# Altium footprint library Standard.PcbLib: 148 footprints (part 9 of 10)
Each footprint in its own frame and in the unit in brackets; x right, y up, seen from the top. Pads: shape width x height; smd on the part's side, far side on the other; paste and mask are expansions set on the pad; w line width, h text height; cw(c..) or ccw(c..) is an arc to the next point about the centre after c.
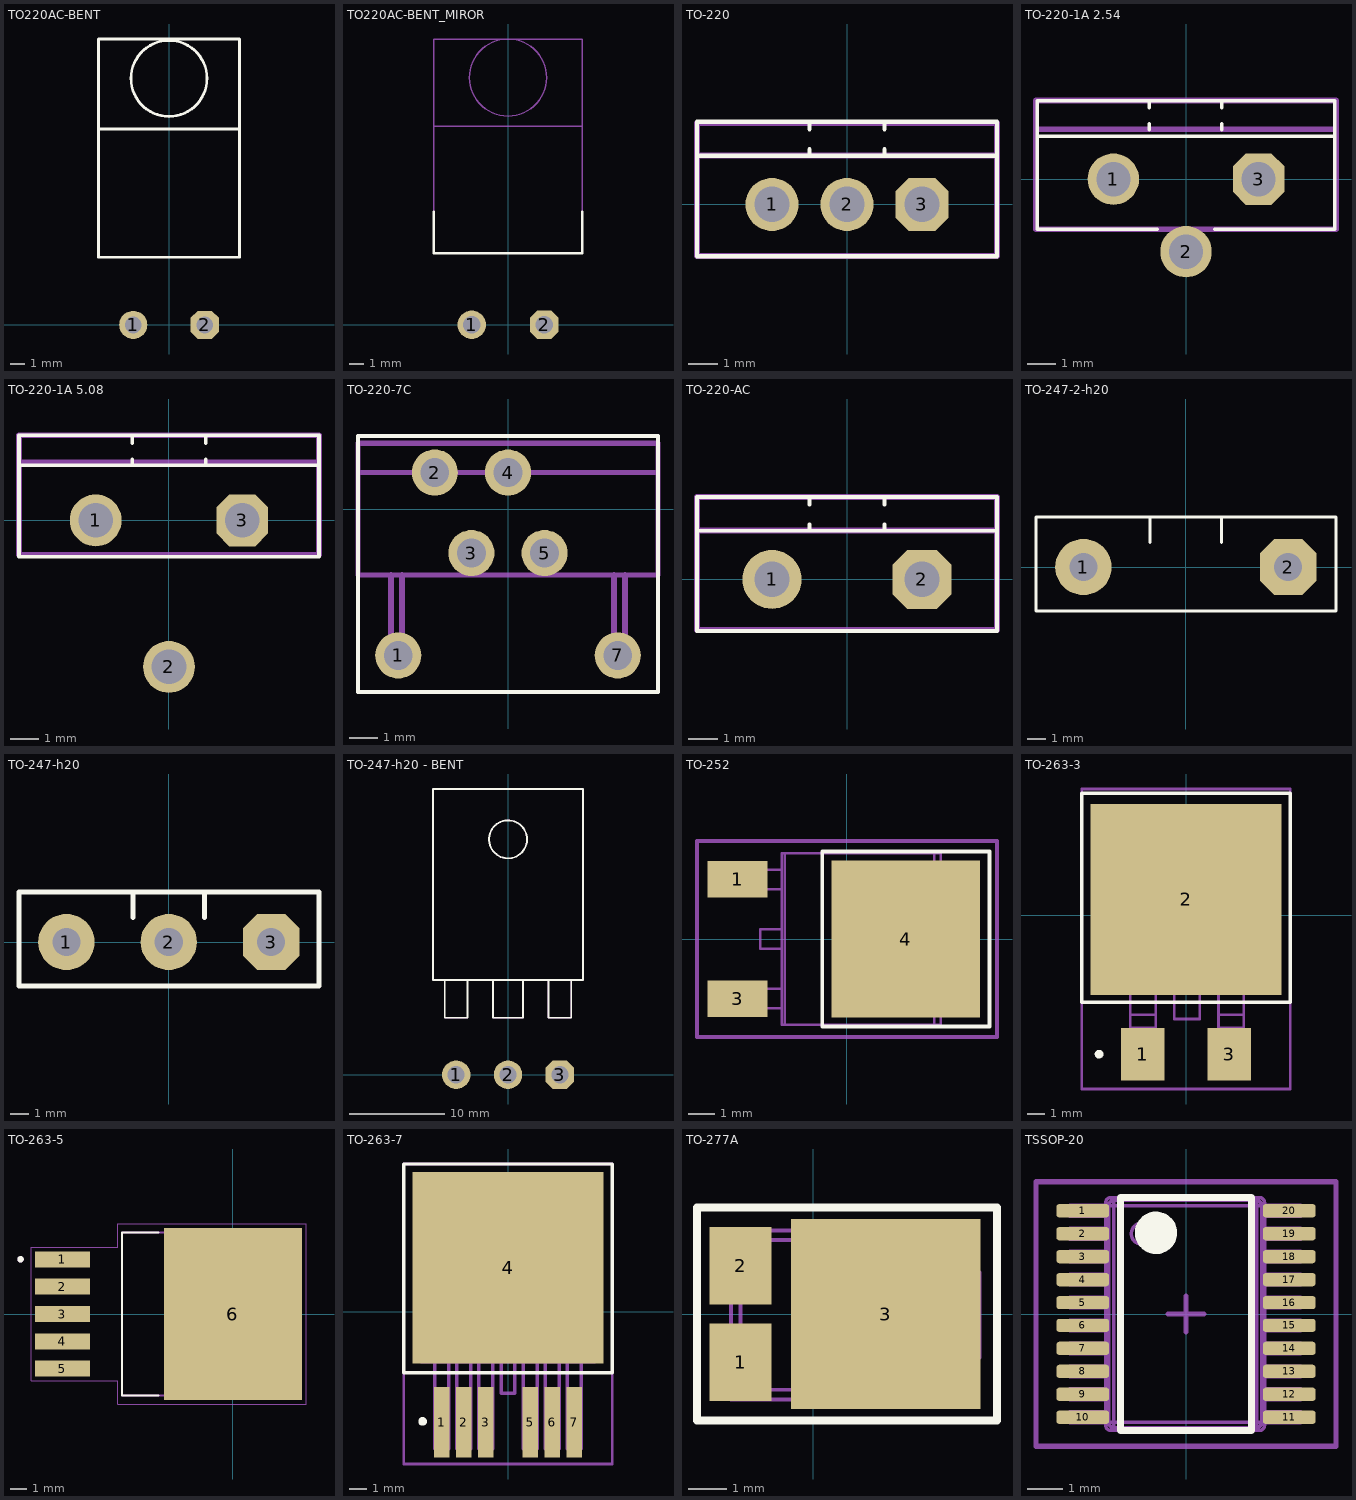
[diagram p8: the footprints below, top view; thin cyan lines are the x and y axes]

## TO220AC-BENT [mm]
pads (2):
  round 2 hole 1.2: 1(-2.54,0)
  oct 2x2 hole 1.2: 2(2.54,0)
Top Overlay:
  circle w0.2: c0,17.5 r2.7
  lines w0.2: -5,13.9 5,13.9 ; -5,20.25 -5,4.8 5,4.8 5,20.25 ; -5,20.3 5,20.3
Top Assembly:
  circle w0.1: c0,17.5 r2.7
  lines w0.1: -5,13.899 5,13.9 ; -5,4.8 5,4.8 5,20.3 -5,20.3 -5,4.8
3D body "User Library-TO220-2pin bent.STEP": height 4.6, standoff -2.47, extent -5,-0.3 5,20.3

## TO220AC-BENT_MIROR [mm]
pads (2):
  round 2 hole 1.2: 1(-2.54,0)
  oct 2x2 hole 1.2: 2(2.54,0)
Top Overlay:
  lines w0.2: -5.2,7.9 -5.2,5 5.2,5 5.2,7.9
Top Assembly:
  circle w0.1: c0,17.3 r2.7
  lines w0.1: -5.2,13.899 5.2,13.9 ; -5.2,5.009 5.2,5.009 5.2,20 -5.2,20 -5.2,5.009
3D body "User Library-TO220-2_OR-INV.STEP": height 2.02, standoff -6.2, extent -5,-0.3 5,20.3

## TO-220 [mm]
pads (3):
  round 1.8 hole 1.2: 1(-2.54,0) 2(0,0)
  oct 1.8x1.8 hole 1.2: 3(2.54,0)
Top Overlay:
  lines w0.15: -5.08,1.651 5.08,1.651 ; -1.27,1.651 -1.27,1.863 ; -1.27,2.54 -1.27,2.794 ; 1.27,1.651 1.27,1.863 ; 1.27,2.54 1.27,2.794 ; -5.08,-1.749 5.08,-1.749 5.08,2.794 -5.08,2.794 -5.08,-1.749
Top Assembly:
  lines w0.2: -5.08,1.651 5.08,1.651 ; -5.08,-1.742 5.08,-1.742 5.08,2.758 -5.08,2.758 -5.08,-1.742
3D body "User Library-TO-220-4.STEP": height 25.06, standoff -3.74, extent -5.12,-1.742 5.08,2.758

## TO-220-1A 2.54 [mm]
pads (3):
  round 1.8 hole 1.2: 1(-2.54,0) 2(0,-2.54)
  oct 1.8x1.8 hole 1.2: 3(2.54,0)
Top Overlay:
  lines w0.125: -5.2,1.5 5.2,1.5 ; -1.29,1.734 -1.29,1.946 ; -1.29,2.496 -1.29,2.75 ; -1,-1.75 -2.525,-1.75 -5.2,-1.75 -5.2,2.75 5.2,2.75 5.2,-1.75 1,-1.75 ; 1.25,1.734 1.25,1.946 ; 1.25,2.496 1.25,2.75
Top Assembly:
  lines w0.2: -0.35,-1.75 -0.35,-2.259 ; 0.45,-1.75 0.45,-2.259 ; -5.25,1.75 -5.25,2.75 5.25,2.75 5.25,1.75 ; -5.25,1.75 5.25,1.75 ; -5.25,1.75 -5.25,1.1 -5.25,-1.75 5.25,-1.75 5.25,1.75 ; -0.35,-2.259 -0.35,-2.495 0.45,-2.495 0.45,-2.259 ; -0.35,-2.259 0.45,-2.259
3D body "TO220-1A 2.54.STEP": height 23.29, standoff -3.87, extent -5.2,-2.991 5.2,2.75

## TO-220-1A 5.08 [mm]
pads (3):
  round 1.8 hole 1.2: 1(-2.54,0) 2(0,-5.08)
  oct 1.8x1.8 hole 1.2: 3(2.54,0)
Top Overlay:
  lines w0.125: -5.2,1.905 5.2,1.905 ; -1.27,1.905 -1.27,2.117 ; -1.27,2.667 -1.27,2.921 ; 1.27,1.905 1.27,2.117 ; 1.27,2.667 1.27,2.921 ; -5.2,-1.27 5.2,-1.27 5.2,2.95 -5.2,2.95 -5.2,-1.27
Top Assembly:
  lines w0.2: -5.2,2 5.2,2 ; -5.2,-1.191 5.2,-1.191 5.2,2.95 -5.2,2.95 -5.2,-1.191
3D body "TO220-1A 5.08.STEP": height 23.29, standoff -2.41, extent -5.2,-5.331 5.2,2.95

## TO-220-7C [mm]
pads (6):
  round 1.6 hole 1: 1(-3.81,-5.08) 2(-2.54,1.27) 3(-1.27,-1.524) 4(0,1.27) 5(1.27,-1.524) 7(3.81,-5.08)
Top Overlay:
  lines w0.15: -5.207,-6.35 5.207,-6.35 5.207,2.54 -5.207,2.54 -5.207,-6.35
Top Assembly:
  lines w0.178: -5.207,1.27 5.207,1.27 ; -5.207,-2.286 5.207,-2.286 5.207,2.286 -5.207,2.286 -5.207,-2.286
  lines w0.2: -4.064,-2.286 -4.064,-5.461 -3.683,-5.461 -3.683,-5.08 -3.683,-2.286 ; 3.683,-2.286 3.683,-5.461 4.064,-5.461 4.064,-5.08 4.064,-2.286
3D body "User Library-TO-220-7C.step": height 19.26, standoff -2.18, extent -5.193,-5.463 5.207,2.667

## TO-220-AC [mm]
pads (2):
  round 2 hole 1.2: 1(-2.54,0)
  oct 2x2 hole 1.2: 2(2.54,0)
Top Overlay:
  lines w0.125: -5.08,1.651 5.08,1.651 ; -1.27,1.651 -1.27,1.863 ; -1.27,2.54 -1.27,2.794 ; 1.27,1.651 1.27,1.863 ; 1.27,2.54 1.27,2.794 ; -5.08,-1.749 5.08,-1.749 5.08,2.794 -5.08,2.794 -5.08,-1.749
Top Assembly:
  lines w0.2: -5,1.651 5,1.651 ; -5.08,-1.706 5.08,-1.706 5.08,2.794 -5.08,2.794 -5.08,-1.706
3D body "User Library-TO220-2_V-L.STEP": height 25.04, standoff -4.46, extent -5,-1.706 5,2.794

## TO-247-2-h20 [mm]
pads (2):
  round 3 hole 1.5: 1(-5.45,0)
  oct 3x3 hole 1.5: 2(5.45,0)
Top Overlay:
  lines w0.15: -1.905,1.3 -1.905,2.66 ; 1.905,1.3 1.905,2.66 ; -7.975,-2.34 -7.975,2.66 8,2.66 8,-2.34 -7.975,-2.34
3D body "User Library-TO247-2.step": height 26, standoff -15.07, extent -7.962,-2.37 7.988,2.66

## TO-247-h20 [mm]
pads (3):
  round 3 hole 1.5: 1(-5.45,0) 2(0,0)
  oct 3x3 hole 1.5: 3(5.45,0)
Top Overlay:
  lines w0.254: -1.905,1.3 -1.905,2.66 ; 1.905,1.3 1.905,2.66 ; -7.975,-2.34 -7.975,2.66 8,2.66 8,-2.34 -7.975,-2.34
Top Assembly:
  lines w0.15: 8,-2.34 8,2.66
  lines w0.2: -1.905,1.3 -1.905,2.66 ; 1.905,1.3 1.905,2.66 ; 8,-2.34 -7.975,-2.34 -7.975,2.66 8,2.66
3D body "TO247-10.STEP": height 26.2, standoff -4.38, extent -8,-2.34 8,2.66

## TO-247-h20 - BENT [mm]
pads (3):
  round 3 hole 1.8: 1(-5.46,0) 2(0,0)
  oct 3x3 hole 1.8: 3(5.46,0)
Top Overlay:
  circle w0.2: c0,24.8 r2
  lines w0.2: -6.66,10 -6.66,6 -4.26,6 -4.26,10 ; -1.6,10 -1.6,6 1.6,6 1.6,10 ; 3.02,10 3.22,10 ; 4.26,10 4.26,6 6.66,6 6.66,10 ; -7.9,10 7.9,10 7.9,30.1 -7.9,30.1 -7.9,10
Top Assembly:
  circle w0.1: c0,24.8 r2
  lines w0.1: -6.66,10 -6.66,6 -4.26,6 -4.26,10 ; -1.6,10 -1.6,6 1.6,6 1.6,10 ; 4.26,10 4.26,6 6.66,6 6.66,10 ; -7.9,10 7.9,10 7.9,30.1 -7.9,30.1 -7.9,10
3D body "TO-247_horizontal_line.stp": height 5, standoff -3, extent -7.8,-0.5 7.8,30.1

## TO-252 [mm] "D-PAK, 3-Pads, Body 6,20x6,71mm (max), IPC Medium Density"
height 2.3
pads (3):
  rect 2.3x1.4 smd: 1(-4.191,2.286) 3(-4.191,-2.286)
  rect 5.7x6 smd: 4(2.25,0)
Top Overlay:
  lines w0.15: -0.95,-3.35 -0.95,3.35 5.461,3.35 5.461,-3.35 -0.95,-3.35
Top Assembly:
  lines w0.1: -4.3,-2.66 -4.1,-2.66 ; -4.3,-2.66 -4.9,-2.66 -4.9,-1.91 -4.3,-1.91 ; -4.3,-2.66 -4.3,-1.91 ; -4.3,-1.91 -4.1,-1.91 ; -4.3,1.91 -4.1,1.91 ; -4.3,1.91 -4.9,1.91 -4.9,2.66 -4.3,2.66 ; -4.3,1.91 -4.3,2.66 ; -4.3,2.66 -4.1,2.66 ; -4.1,-2.66 -4.1,-1.91 ; -4.1,-2.66 -3.45,-2.66 ; -4.1,-1.91 -3.45,-1.91 ; -4.1,1.91 -4.1,2.66 ; -4.1,1.91 -3.45,1.91 ; -4.1,2.66 -3.45,2.66 ; -3.45,-2.66 -2.5,-2.66 ; -3.45,-2.66 -3.45,-1.91 ; -3.45,-1.91 -2.5,-1.91 ; -3.45,1.91 -2.5,1.91 ; -3.45,1.91 -3.45,2.66 ; -3.45,2.66 -2.5,2.66 ; -2.5,-2.66 -2.5,-3.29 -2.39,-3.29 ; -2.5,-2.66 -2.5,-1.91 ; -2.5,-1.91 -2.5,-0.375 ; -2.5,-0.375 -2.5,0.375 ; -2.5,-0.375 -3.33,-0.375 -3.33,0.375 -2.5,0.375 ; -2.5,0.375 -2.5,1.91 ; -2.5,1.91 -2.5,2.66 ; -2.5,2.66 -2.5,3.29 -2.39,3.29 ; -2.39,-3.29 -2.39,3.29 ; -2.39,-3.29 3.35,-3.29 ; -2.39,3.29 3.35,3.29 ; 3.35,-3.29 3.6,-3.29 3.6,-2.68 ; 3.35,-3.29 3.35,3.29 ; 3.35,3.29 3.6,3.29 3.6,2.68 ; 3.6,-2.68 3.6,-1.675 ; 3.6,-2.68 4.8,-2.68 4.8,-1.93 4.3,-1.93 4.3,1.93 4.8,1.93 4.8,2.68 3.6,2.68 ; 3.6,-1.675 ccw(c3.55,-1.43) 3.8,-1.43 3.8,1.43 ccw(c3.55,1.43) 3.6,1.675 ; 3.6,-1.675 3.6,1.675 ; 3.6,1.675 3.6,2.68
Top Component Outline:
  lines w0.15: -0.5,0 0.5,0 ; 0,-0.5 0,0.5 ; -5.75,-3.75 -5.75,3.75 5.75,3.75 5.75,-3.75 -5.75,-3.75
3D body "TO-252.STEP": height 2.35, standoff 0, extent -5.06,-3.29 5.08,3.29

## TO-263-3 [mm]
pads (3):
  rect 2.5x3 smd: 1(-2.5,-8) 3(2.5,-8)
  rect 11x11 smd: 2(0,0.9)
Top Overlay:
  circle w0.25: c-5,-8 r0.125
  lines w0.2: -6,-5 -6,7 6,7 6,-5 -6,-5
Top Assembly:
  lines w0.15: -3.209,-4.263 -5.019,-4.263 ; -1.749,-4.263 -0.669,-4.263 ; 0.791,-4.263 1.871,-4.263 ; 3.331,-4.263 5.141,-4.263 ; -5.019,-4.263 -4.705,-3.949 ; -5.019,-4.263 -5.019,4.752 ; -5.019,4.752 -4.705,4.438 ; -5.019,4.752 -4.888,4.882 ; -4.888,4.882 5.011,4.882 ; -4.888,4.882 -4.888,5.226 -3.388,6.092 3.511,6.092 5.011,5.226 5.011,4.882 ; -4.705,-3.949 -4.705,4.438 ; -4.705,-3.949 4.827,-3.949 ; -4.705,4.438 4.827,4.438 ; -3.209,-6.49 -3.209,-5.729 ; -3.209,-6.49 -3.209,-6.806 -2.854,-6.806 -2.854,-7.122 ; -3.209,-6.49 -1.749,-6.49 ; -3.209,-5.729 -3.209,-4.193 -1.749,-4.193 -1.749,-5.729 ; -3.209,-5.729 -1.749,-5.729 ; -2.854,-9.135 -2.104,-9.135 ; -2.854,-9.135 -2.854,-7.395 ; -2.854,-9.135 -2.854,-9.172 -2.104,-9.172 -2.104,-9.135 ; -2.854,-7.395 -2.854,-7.122 ; -2.854,-7.395 -2.104,-7.395 ; -2.854,-7.122 -2.104,-7.122 ; -2.104,-9.135 -2.104,-7.395 ; -2.104,-7.395 -2.104,-7.122 ; -2.104,-7.122 -2.104,-6.806 -1.749,-6.806 -1.749,-6.49 ; -1.749,-6.49 -1.749,-5.729 ; 1.871,-6.49 1.871,-5.729 ; 1.871,-6.49 1.871,-6.806 2.226,-6.806 2.226,-7.122 ; 1.871,-6.49 3.331,-6.49 ; 1.871,-5.729 1.871,-4.193 3.331,-4.193 3.331,-5.729 ; 1.871,-5.729 3.331,-5.729 ; 2.226,-9.135 2.976,-9.135 ; 2.226,-9.135 2.226,-7.395 ; 2.226,-9.135 2.226,-9.172 2.976,-9.172 2.976,-9.135 ; 2.226,-7.395 2.226,-7.122 ; 2.226,-7.395 2.976,-7.395 ; 2.226,-7.122 2.976,-7.122 ; 2.976,-9.135 2.976,-7.395 ; 2.976,-7.395 2.976,-7.122 ; 2.976,-7.122 2.976,-6.806 3.331,-6.806 3.331,-6.49 ; 3.331,-6.49 3.331,-5.729 ; 4.827,-3.949 5.141,-4.263 ; 4.827,-3.949 4.827,4.438 ; 4.827,4.438 5.141,4.752 ; 5.011,4.882 5.141,4.752 ; 5.141,-4.263 5.141,4.752 ; -0.669,-5.973 0.791,-5.973 0.791,-4.193 -0.669,-4.193 -0.669,-5.973
Top Component Outline:
  lines w0.15: -6,-10 6,-10 6,7.25 -6,7.25 -6,-10
3D body "User Library-DPAK (1).step": height 4.98, standoff -0.03, extent -5.08,-9.25 5.08,6.014

## TO-263-5 [mm]
pads (6):
  rect 3.4x1 smd paste-3 mask+0: 1(-10.6,3.4) 2(-10.6,1.7) 3(-10.6,0) 4(-10.6,-1.7) 5(-10.6,-3.4)
  rect 8.6x10.7 smd paste-6 mask+0: 6(0,0)
Top Overlay:
  circle w0.2: c-13.2,3.4 r0.1
  lines w0.127: -4.62,-5.08 -6.905,-5.08 -6.905,5.08 -4.62,5.08
Top Paste:
  region: -8.95,-3.85 -12.25,-3.85 -12.25,-2.95 -8.95,-2.95
  region: -8.95,-2.15 -12.25,-2.15 -12.25,-1.25 -8.95,-1.25
  region: -8.95,2.95 -12.25,2.95 -12.25,3.85 -8.95,3.85
  region: -8.95,1.25 -12.25,1.25 -12.25,2.15 -8.95,2.15
  region: -8.95,-0.45 -12.25,-0.45 -12.25,0.45 -8.95,0.45
  region: 4.25,-5.3 -4.25,-5.3 -4.25,5.3 4.25,5.3
Top Solder:
  region: -8.83,-3.97 -12.37,-3.97 -12.37,-2.83 -8.83,-2.83
  region: -8.83,-2.27 -12.37,-2.27 -12.37,-1.13 -8.83,-1.13
  region: -8.83,2.83 -12.37,2.83 -12.37,3.97 -8.83,3.97
  region: -8.83,1.13 -12.37,1.13 -12.37,2.27 -8.83,2.27
  region: -8.83,-0.57 -12.37,-0.57 -12.37,0.57 -8.83,0.57
  region: 4.37,-5.42 -4.37,-5.42 -4.37,5.42 4.37,5.42
Top Assembly:
  circle w0.2: c-13.2,3.4 r0.1
  lines w0.127: -6.905,-5.08 2.02,-5.08 2.02,5.08 -6.905,5.08 -6.905,-5.08
Top Component Outline:
  lines w0.05: -12.55,-4.15 -12.55,4.15 -7.155,4.15 -7.155,5.6 4.55,5.6 4.55,-5.6 -7.155,-5.6 -7.155,-4.15 -12.55,-4.15
3D body "LM2596SX-ADJ.STEP": height 4.65, standoff -0.15, extent -11.5,-5.08 2.851,5.08

## TO-263-7 [mm] "D2-PAK, 7-Pads, Body 7,93x8,69mm (max), IPC Medium Density"
height 4.8
pads (7):
  rect 0.9x4.05 smd: 1(-3.81,-6.35) 2(-2.54,-6.35) 3(-1.27,-6.35) 5(1.27,-6.35) 6(2.54,-6.35) 7(3.81,-6.35)
  rect 11x11 smd: 4(0,2.54)
Top Overlay:
  circle w0.25: c-4.91,-6.3 r0.125
  lines w0.2: -6,-3.5 -6,8.5 6,8.5 6,-3.5 -6,-3.5
Top Assembly:
  drawing of 182 lines, arcs and shapes, not listed
Top Component Outline:
  lines w0.15: -0.5,0 0.5,0 ; 0,-0.5 0,0.5 ; -6,-8.75 6,-8.75 6,8.5 -6,8.5 -6,-8.75
3D body "SW3dPS-TO263-7S.STEP": height 4.88, standoff 0.08, extent -5,-7.869 5,7.801

## TO-277A [mm]
pads (3):
  rect 1.6x2 smd: 1(-1.875,-1.25) 2(-1.875,1.25)
  rect 4.9x4.9 smd: 3(1.875,0)
Top Overlay:
  lines w0.2: -3,-2.75 -3,2.75 4.75,2.75 4.75,-2.75 -3,-2.75
Top Assembly:
  lines w0.1: -2.124,-1.806 -2.375,-1.806 -2.375,-0.451 -2.124,-0.451 ; -2.124,0.402 -2.375,0.402 -2.375,1.756 -2.124,1.756 ; -0.263,-2.207 -0.263,-2.408 0.49,-2.408 0.49,-2.207 ; -0.263,2.158 -0.263,2.359 0.49,2.359 0.49,2.158 ; 4.047,-1.129 4.298,-1.129 4.298,1.079 4.047,1.079 ; -2.124,-2.207 -2.124,2.158 ; -2.124,-2.207 4.047,-2.207 ; -2.124,-2.207 -1.873,-1.957 ; -2.124,2.158 4.047,2.158 ; -2.124,2.158 -1.873,1.907 ; -1.873,-1.957 -1.873,1.907 ; -1.873,-1.957 3.797,-1.957 ; -1.873,1.907 3.797,1.907 ; 3.797,-1.957 3.797,1.907 ; 3.797,-1.957 4.047,-2.207 ; 3.797,1.907 4.047,2.158 ; 4.047,-2.207 4.047,2.158
Top Component Outline:
  lines w0.15: 0.125,0 1.125,0 ; 0.625,-0.5 0.625,0.5 ; -3,-2.75 -3,2.75 4.75,2.75 4.75,-2.75 -3,-2.75
3D body "User Library-TO-277A.step": height 1.2, standoff 0, extent -2.375,-2.375 4.275,2.375

## TSSOP-20 [mm] "SOP, 20-Leads, Body 6,50x4,40mm, Pitch 0,65mm, IPC Medium Density"
height 2.65
pads (20):
  rrect50% 1.5x0.38 smd mask+0.075: 1(-2.925,2.925) 2(-2.925,2.275) 3(-2.925,1.625) 4(-2.925,0.975) 5(-2.925,0.325) 6(-2.925,-0.325) 7(-2.925,-0.975) 8(-2.925,-1.625) 9(-2.925,-2.275) 10(-2.925,-2.925) 11(2.925,-2.925) 12(2.925,-2.275) 13(2.925,-1.625) 14(2.925,-0.975) 15(2.925,-0.325) 16(2.925,0.325) 17(2.925,0.975) 18(2.925,1.625) 19(2.925,2.275) 20(2.925,2.925)
Top Overlay:
  circle w0.6: c-0.85,2.3 r0.3
  lines w0.2: -1.85,-3.3 1.85,-3.3 1.85,3.3 -1.85,3.3 -1.85,-3.3
Top Assembly:
  drawing of 315 lines, arcs and shapes, not listed
Top Component Outline:
  lines w0.15: -0.5,0 0.5,0 ; 0,-0.5 0,0.5 ; -4.25,-3.75 4.25,-3.75 4.25,3.75 -4.25,3.75 -4.25,-3.75
3D body "User Library-TSSOP-20.step": height 1.2, standoff 0, extent -3.275,-3.3 3.275,3.3